# Altium footprint library 自建库.PcbLib: 169 footprints (part 9 of 11)
Each footprint in its own frame and in the unit in brackets; x right, y up, seen from the top. Pads: shape width x height; smd on the part's side, far side on the other; paste and mask are expansions set on the pad; w line width, h text height; cw(c..) or ccw(c..) is an arc to the next point about the centre after c.
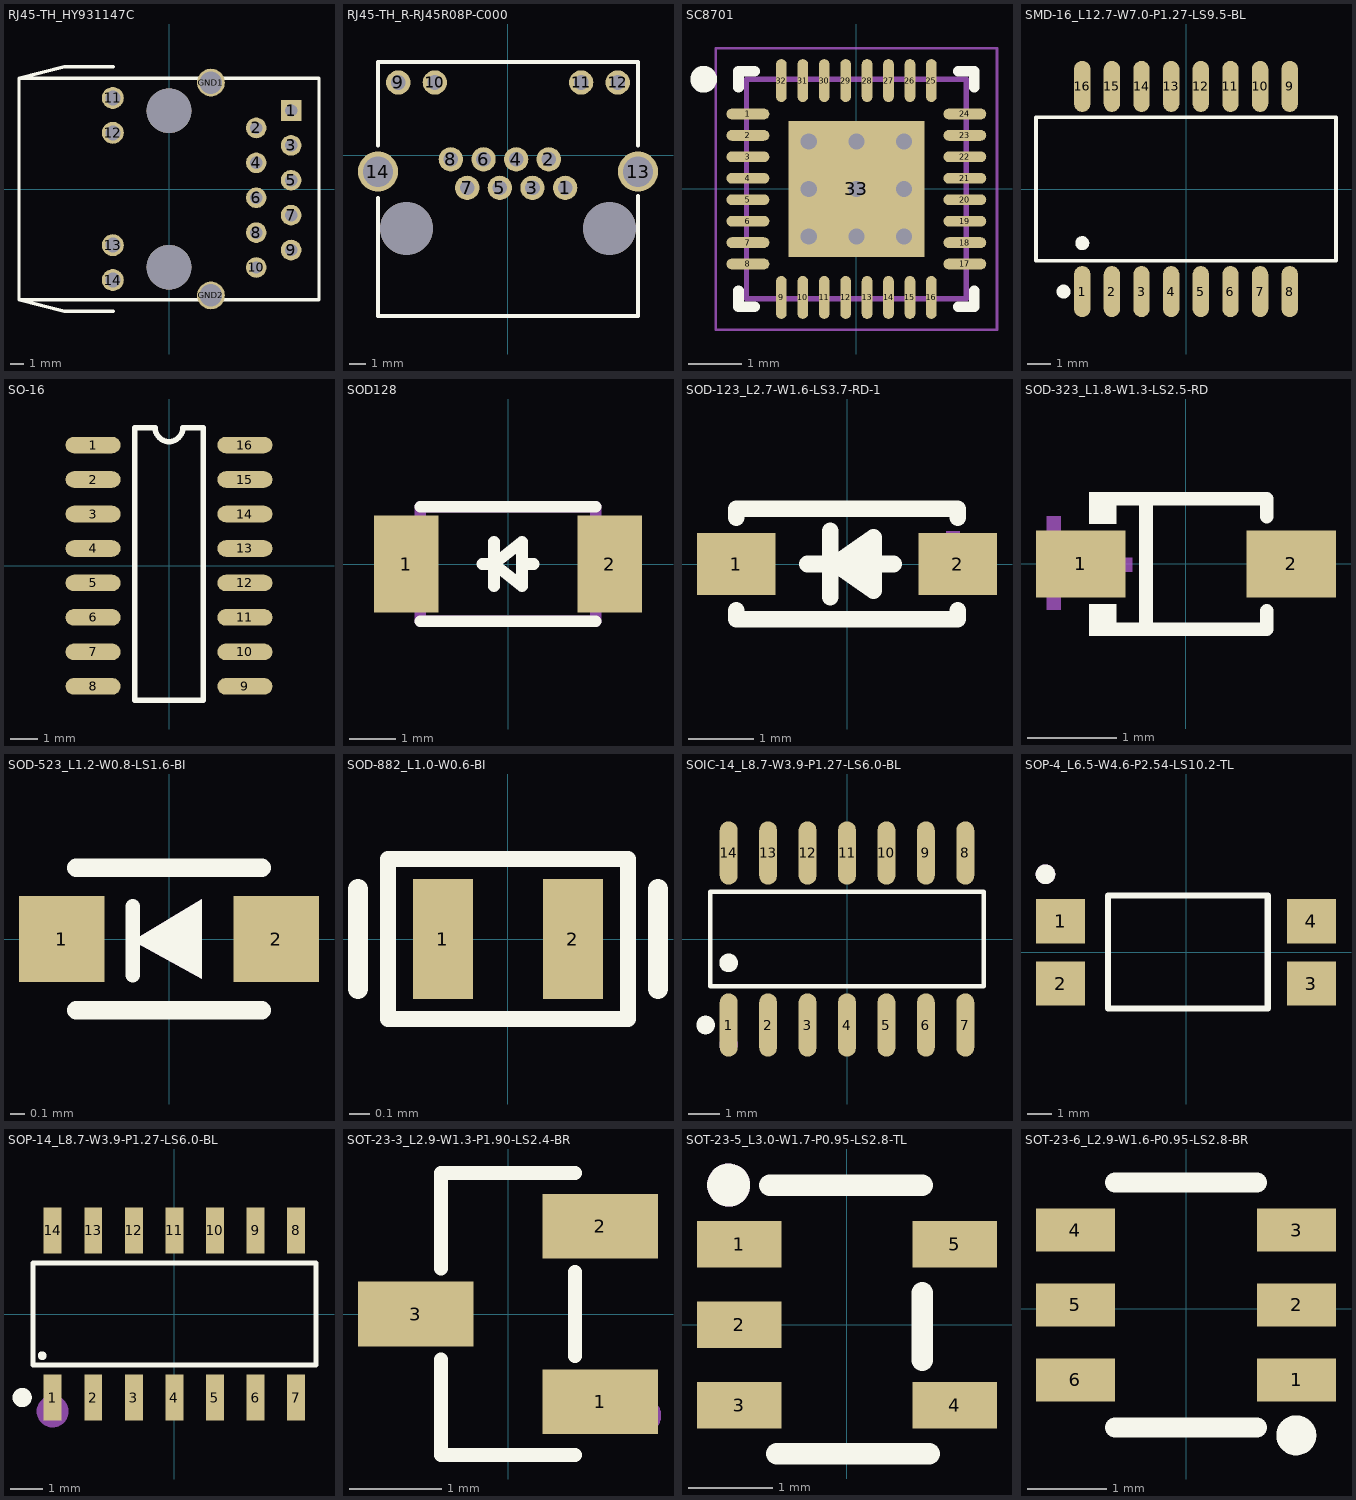
[diagram p8: the footprints below, top view; thin cyan lines are the x and y axes]

## RJ45-TH_HY931147C [mm] "RJ45"
pads (18):
  rect 1.5x1.5 hole 0.9: 1(8.89,5.715)
  round 1.5 hole 0.9: 2(6.35,4.445) 3(8.89,3.175) 4(6.35,1.905) 5(8.89,0.635) 6(6.35,-0.635) 7(8.89,-1.905) 8(6.35,-3.175) 9(8.89,-4.445) 10(6.35,-5.715)
  round 1.6 hole 1.1: 11(-4.089,6.629) 12(-4.089,4.089) 13(-4.089,-4.089) 14(-4.089,-6.629)
  round 2.029 hole 1.631: GND1(3.048,7.747) GND2(3.048,-7.747)
  round 3.25 hole 3.25 unplated: ""(0,-5.7) ""(0,5.7)
Top Overlay:
  lines w0.254: -4.064,-8.89 -7.62,-8.89 -10.922,-8.052 ; -4.064,8.89 -7.62,8.89 -10.922,8.052 ; 1.27,-8.052 -10.922,-8.052 ; 1.27,8.052 -10.922,8.052 ; 4.572,-8.052 10.922,-8.052 ; 4.572,8.052 10.922,8.052 ; -10.922,-8.052 -10.922,8.052 ; -10.922,-8.052 10.922,-8.052 ; -10.922,-8.052 -10.922,8.052 ; -10.922,8.052 10.922,8.052 ; 10.922,-8.052 10.922,8.052 ; 10.922,-8.052 10.922,8.052
3D body "RJ45.stp": height 3.58, standoff -14.39, extent -10.922,-8.53 10.668,8.53

## RJ45-TH_R-RJ45R08P-C000 [mm]
pads (16):
  round 1.524 hole 0.914: 1(3.57,-2.025) 2(2.55,-0.245) 3(1.53,-2.025) 4(0.51,-0.245) 5(-0.51,-2.025) 6(-1.53,-0.245) 7(-2.55,-2.025) 8(-3.57,-0.245) 9(-6.86,4.565) 10(-4.57,4.565) 11(4.57,4.565) 12(6.86,4.565)
  round 2.5 hole 1.9: 13(8.13,-1.005) 14(-8.13,-1.005)
  round 3.3 hole 3.3 unplated: ""(-6.35,-4.565) ""(6.35,-4.565)
Top Overlay:
  lines w0.254: -8.13,0.635 -8.13,5.842 8.13,5.842 8.13,0.635 ; -8.128,-2.667 -8.128,-10.033 8.128,-10.033 8.128,-2.54
Mechanical 15:
  circle w1.5: c6.35,-4.565 r0.75
  circle w1.5: c-6.35,-4.565 r0.75
3D body "RJ45R08P-C000.stp": height 12.8, standoff -3, extent -8.226,-10.033 8.226,6.017

## SC8701 [mm] "QFN32-4*4"
pads (33):
  oval 0.8x0.2 smd: 1(-2.025,1.4) 2(-2.025,1) 3(-2.025,0.6) 4(-2.025,0.2) 5(-2.025,-0.2) 6(-2.025,-0.6) 7(-2.025,-1) 8(-2.025,-1.4) 17(2.025,-1.4) 18(2.025,-1) 19(2.025,-0.6) 20(2.025,-0.2) 21(2.025,0.2) 22(2.025,0.6) 23(2.025,1) 24(2.025,1.4)
  oval 0.2x0.8 smd: 9(-1.4,-2.025) 10(-1,-2.025) 11(-0.6,-2.025) 12(-0.2,-2.025) 13(0.2,-2.025) 14(0.6,-2.025) 15(1,-2.025) 16(1.4,-2.025) 25(1.4,2.025) 26(1,2.025) 27(0.6,2.025) 28(0.2,2.025) 29(-0.2,2.025) 30(-0.6,2.025) 31(-1,2.025) 32(-1.4,2.025)
  rect 2.54x2.54 smd: 33(0,0)
via 0,0 diameter 0.5 hole 0.3
via -0.889,0.889 diameter 0.5 hole 0.3
via 0,0.889 diameter 0.5 hole 0.3
via 0.889,0.889 diameter 0.5 hole 0.3
via -0.889,0 diameter 0.5 hole 0.3
via -0.889,-0.889 diameter 0.5 hole 0.3
via 0,-0.889 diameter 0.5 hole 0.3
via 0.889,-0.889 diameter 0.5 hole 0.3
via 0.889,0 diameter 0.5 hole 0.3
Top Overlay:
  circle w0.25: c-2.85,2.05 r0.125
  lines w0.2: -2.2,-1.9 -2.2,-2.2 -1.9,-2.2 ; -2.2,1.9 -2.2,2.2 -1.9,2.2 ; 1.9,-2.2 2.2,-2.2 2.2,-1.9 ; 1.9,2.2 2.2,2.2 2.2,1.9
Mechanical 13:
  lines w0.1: -2.05,-2.05 -2.05,2.05 2.05,2.05 2.05,-2.05 -2.05,-2.05
Mechanical 15:
  lines w0.05: -2.625,-2.625 -2.625,2.625 2.625,2.625 2.625,-2.625 -2.625,-2.625
  lines w0.1: -0.5,0 0.5,0 ; 0,-0.5 0,0.5
3D body: height 0.8, standoff 0, extent -2.05,-2.05 2.05,2.05

## SMD-16_L12.7-W7.0-P1.27-LS9.5-BL [mm]
pads (16):
  oval 0.7x2.19 smd: 1(-4.445,-4.395) 2(-3.175,-4.395) 3(-1.905,-4.395) 4(-0.635,-4.395) 5(0.635,-4.395) 6(1.905,-4.395) 7(3.175,-4.395) 8(4.445,-4.395) 9(4.445,4.395) 10(3.175,4.395) 11(1.905,4.395) 12(0.635,4.395) 13(-0.635,4.395) 14(-1.905,4.395) 15(-3.175,4.395) 16(-4.445,4.395)
Top Overlay:
  circle w0.3: c-4.445,-2.319 r0.15
  circle w0.3: c-5.247,-4.395 r0.15
  lines w0.152: -6.426,-3.071 -6.426,3.071 6.426,3.071 6.426,-3.071 -6.426,-3.071
Mechanical 15:
  circle w0.3: c-4.445,-5.15 r0.15
3D body "H1606CG.stp": height 5.95, standoff 0, extent -6.35,-4.75 6.35,4.75

## SO-16 [mil]
pads (16):
  oval 80x24 smd: 1(-110,175) 2(-110,125) 3(-110,75) 4(-110,25) 5(-110,-25) 6(-110,-75) 7(-110,-125) 8(-110,-175) 9(110,-175) 10(110,-125) 11(110,-75) 12(110,-25) 13(110,25) 14(110,75) 15(110,125) 16(110,175)
Top Overlay:
  lines w8: -50,-195 -50,200 -20,200 ccw(c0,200) 20,200 50,200 50,-195 -50,-195
3D body "SO16.STEP": height 66.93, standoff 0, extent -118.11,-200.79 118.11,200.79

## SOD128 [mil]
pads (2):
  rect 55.1x82.7 smd: 1(-87,0) 2(87,0)
Top Overlay:
  lines w10: -75,-49 75,-49 ; -75,49 75,49 ; -22,0 -12,0 ; -12,-19 -12,0 ; -12,19 -12,0 ; 22,0 12,0 ; -12,0 12,19 12,0 ; -12,0 12,-19 12,0
Mechanical 15:
  lines w10: -75,-49 -75,49 75,49 75,-49 -75,-49
3D body "SOD128.STEP": height 40.35, standoff 0, extent -94.49,-49.21 94.49,49.21

## SOD-123_L2.7-W1.6-LS3.7-RD-1 [mm]
pads (2):
  rect 1.2x0.95 smd: 1(-1.7,0) 2(1.7,0)
Top Overlay:
  region: 0.406,-0.406 0.406,0.406 -0.178,0
  lines w0.254: -1.7,-0.706 -1.7,-0.85 1.7,-0.85 1.7,-0.706 ; -1.7,0.706 -1.7,0.85 1.7,0.85 1.7,0.706 ; -1.644,0.849 -1.643,0.85 -1.346,0.85 ; -1.639,-0.849 -1.638,-0.85 -1.346,-0.85 ; -0.61,0 -0.28,0 ; -0.254,-0.508 -0.254,0.508 ; 0.406,0 0.72,0 ; -0.178,0 0.406,-0.406 0.406,0.406 -0.178,0
Mechanical 15:
  region: -0.3,0 0.406,-0.406 0.406,0.406
  region: -2.042,0.124 -1.2,0.124 -1.2,-0.083 -2.042,-0.083
  region: 1.525,-0.338 1.525,0.504 1.732,0.504 1.732,-0.339
  region: 1.19,0.212 2.032,0.212 2.032,0.005 1.189,0.005
3D body "SOD123-1.STEP": height 1.18, standoff 0, extent -1.95,-0.9 1.95,0.9

## SOD-323_L1.8-W1.3-LS2.5-RD [mm]
pads (2):
  rect 1x0.75 smd: 1(-1.173,0) 2(1.173,0)
Top Overlay:
  region: -0.775,-0.802 -0.775,-0.45 -1.08,-0.45 -1.08,-0.802
  region: -0.775,0.802 -0.775,0.45 -1.08,0.45 -1.08,0.802
  lines w0.152: -0.851,-0.726 0.901,-0.726 0.901,-0.52 ; -0.851,0.726 0.901,0.726 0.901,0.53 ; -0.447,-0.726 -0.447,0.726
Mechanical 15:
  region: 1.315,0.09 1.315,-0.066 0.691,-0.066 0.691,0.09
  region: -1.225,0.07 -1.225,-0.086 -0.601,-0.086 -0.601,0.07
  region: -1.397,0.532 -1.397,-0.508 -1.553,-0.508 -1.553,0.532
3D body "SOD323-1.STEP": height 1.1, standoff 0, extent -1.3,-0.675 1.3,0.675

## SOD-523_L1.2-W0.8-LS1.6-BI [mm]
pads (2):
  rect 0.6x0.6 smd: 1(-0.75,0) 2(0.75,0)
Top Overlay:
  region: -0.254,-0.013 0.229,0.279 0.229,-0.279
  lines w0.1: -0.254,-0.254 -0.254,0.229
  lines w0.13: -0.65,-0.5 0.65,-0.5 ; -0.65,0.5 0.65,0.5
Mechanical 15:
  region: 0.229,0.279 0.229,-0.279 -0.254,-0.013
3D body "SOD523.STEP": height 0.71, standoff 0, extent -0.915,-0.424 0.915,0.424

## SOD-882_L1.0-W0.6-BI [mm]
pads (2):
  rect 0.3x0.6 smd paste+0 mask+0.05: 1(-0.325,0) 2(0.325,0)
Top Overlay:
  lines w0.08: -0.6,-0.4 0.6,-0.4 0.6,0.4 -0.6,0.4 -0.6,-0.4
  lines w0.1: -0.75,-0.25 -0.75,0.25 ; 0.75,-0.25 0.75,0.25
3D body "882.stp": height 0.5, standoff 0, extent -0.51,-0.3 0.51,0.3

## SOIC-14_L8.7-W3.9-P1.27-LS6.0-BL [mm]
pads (14):
  oval 0.574x2.038 smd paste+0 mask+0.051: 1(-3.81,-2.769) 2(-2.54,-2.769) 3(-1.27,-2.769) 4(0,-2.769) 5(1.27,-2.769) 6(2.54,-2.769) 7(3.81,-2.769) 8(3.81,2.769) 9(2.54,2.769) 10(1.27,2.769) 11(0,2.769) 12(-1.27,2.769) 13(-2.54,2.769) 14(-3.81,2.769)
Top Overlay:
  circle w0.3: c-4.549,-2.769 r0.15
  circle w0.3: c-3.81,-0.769 r0.15
  lines w0.152: -4.401,-1.521 4.401,-1.521 4.401,1.521 -4.401,1.521 -4.401,-1.521
Mechanical 15:
  circle w0.3: c-3.81,-3.4 r0.15

## SOP-4_L6.5-W4.6-P2.54-LS10.2-TL [mm]
pads (4):
  rect 2x1.8 smd paste+0 mask+0.051: 1(-5.1,1.27) 2(-5.1,-1.27) 3(5.1,-1.27) 4(5.1,1.27)
Top Overlay:
  circle w0.4: c-5.715,3.175 r0.2
  lines w0.254: -3.175,-2.286 3.325,-2.286 3.325,2.314 -3.175,2.314 -3.175,-2.286
Mechanical 15:
  circle w0.4: c-5.715,3.175 r0.2
3D body "17c.stp": height 4.63, standoff 0, extent -5.15,-2.3 5.15,2.3

## SOP-14_L8.7-W3.9-P1.27-LS6.0-BL [mm]
pads (14):
  rect 0.56x1.43 smd paste+0 mask+0.051: 1(-3.81,-2.615) 2(-2.54,-2.615) 3(-1.27,-2.615) 4(0,-2.615) 5(1.27,-2.615) 6(2.54,-2.615) 7(3.81,-2.615) 8(3.81,2.615) 9(2.54,2.615) 10(1.27,2.615) 11(0,2.615) 12(-1.27,2.615) 13(-2.54,2.615) 14(-3.81,2.615)
Top Overlay:
  circle w0.137: c-4.136,-1.305 r0.069
  circle w0.4: c-4.763,-2.615 r0.1
  lines w0.152: -4.426,-1.595 -4.426,1.595 4.426,1.595 4.426,-1.595 -4.426,-1.595
Mechanical 15:
  circle w0.5: c-3.81,-3.048 r0.25

## SOT-23-3_L2.9-W1.3-P1.90-LS2.4-BR [mm]
pads (3):
  rect 1.25x0.7 smd: 1(1,-0.95) 2(1,0.95) 3(-1,0)
Top Overlay:
  lines w0.152: -0.726,-0.495 -0.726,-1.526 0.726,-1.526 ; -0.726,0.495 -0.726,1.526 0.726,1.526 ; 0.726,-0.455 0.726,0.455
Mechanical 15:
  circle w0.2: c1.46,-1.1 r0.1
3D body "SOT23-3.stp": height 1, standoff 0, extent -1.195,-1.45 1.195,1.47

## SOT-23-5_L3.0-W1.7-P0.95-LS2.8-TL [mm]
pads (5):
  rect 1x0.55 smd: 1(-1.271,0.95) 2(-1.271,0) 3(-1.271,-0.95) 4(1.271,-0.95) 5(1.271,0.95)
Top Overlay:
  circle w0.254: c-1.397,1.651 r0.127
  lines w0.254: -0.911,1.651 0.889,1.651 ; -0.83,-1.522 0.97,-1.522 ; 0.889,-0.419 0.889,0.381
Mechanical 15:
  circle w0.254: c-1.397,1.651 r0.127
3D body "SOT23-5-2.STEP": height 1.45, standoff 0, extent -1.4,-1.45 1.4,1.45

## SOT-23-6_L2.9-W1.6-P0.95-LS2.8-BR [mm]
pads (6):
  rect 1x0.55 smd: 1(1.4,-0.899) 2(1.4,0.051) 3(1.4,1.001) 4(-1.4,1.001) 5(-1.4,0.051) 6(-1.4,-0.899)
Top Overlay:
  circle w0.254: c1.397,-1.6 r0.127
  lines w0.254: -0.9,-1.5 0.9,-1.5 ; -0.9,1.6 0.9,1.6
Mechanical 15:
  circle w0.2: c1.4,-0.899 r0.1
3D body "SOT-23-6.STEP": height 1.09, standoff 0, extent -1.251,-1.347 1.175,1.447